# Altium footprint library Connector_PinHeader_2.00mm.PcbLib: 278 footprints (part 2 of 18)
Each footprint in its own frame and in the unit in brackets; x right, y up, seen from the top. Pads: shape width x height; smd on the part's side, far side on the other; paste and mask are expansions set on the pad; w line width, h text height; cw(c..) or ccw(c..) is an arc to the next point about the centre after c.
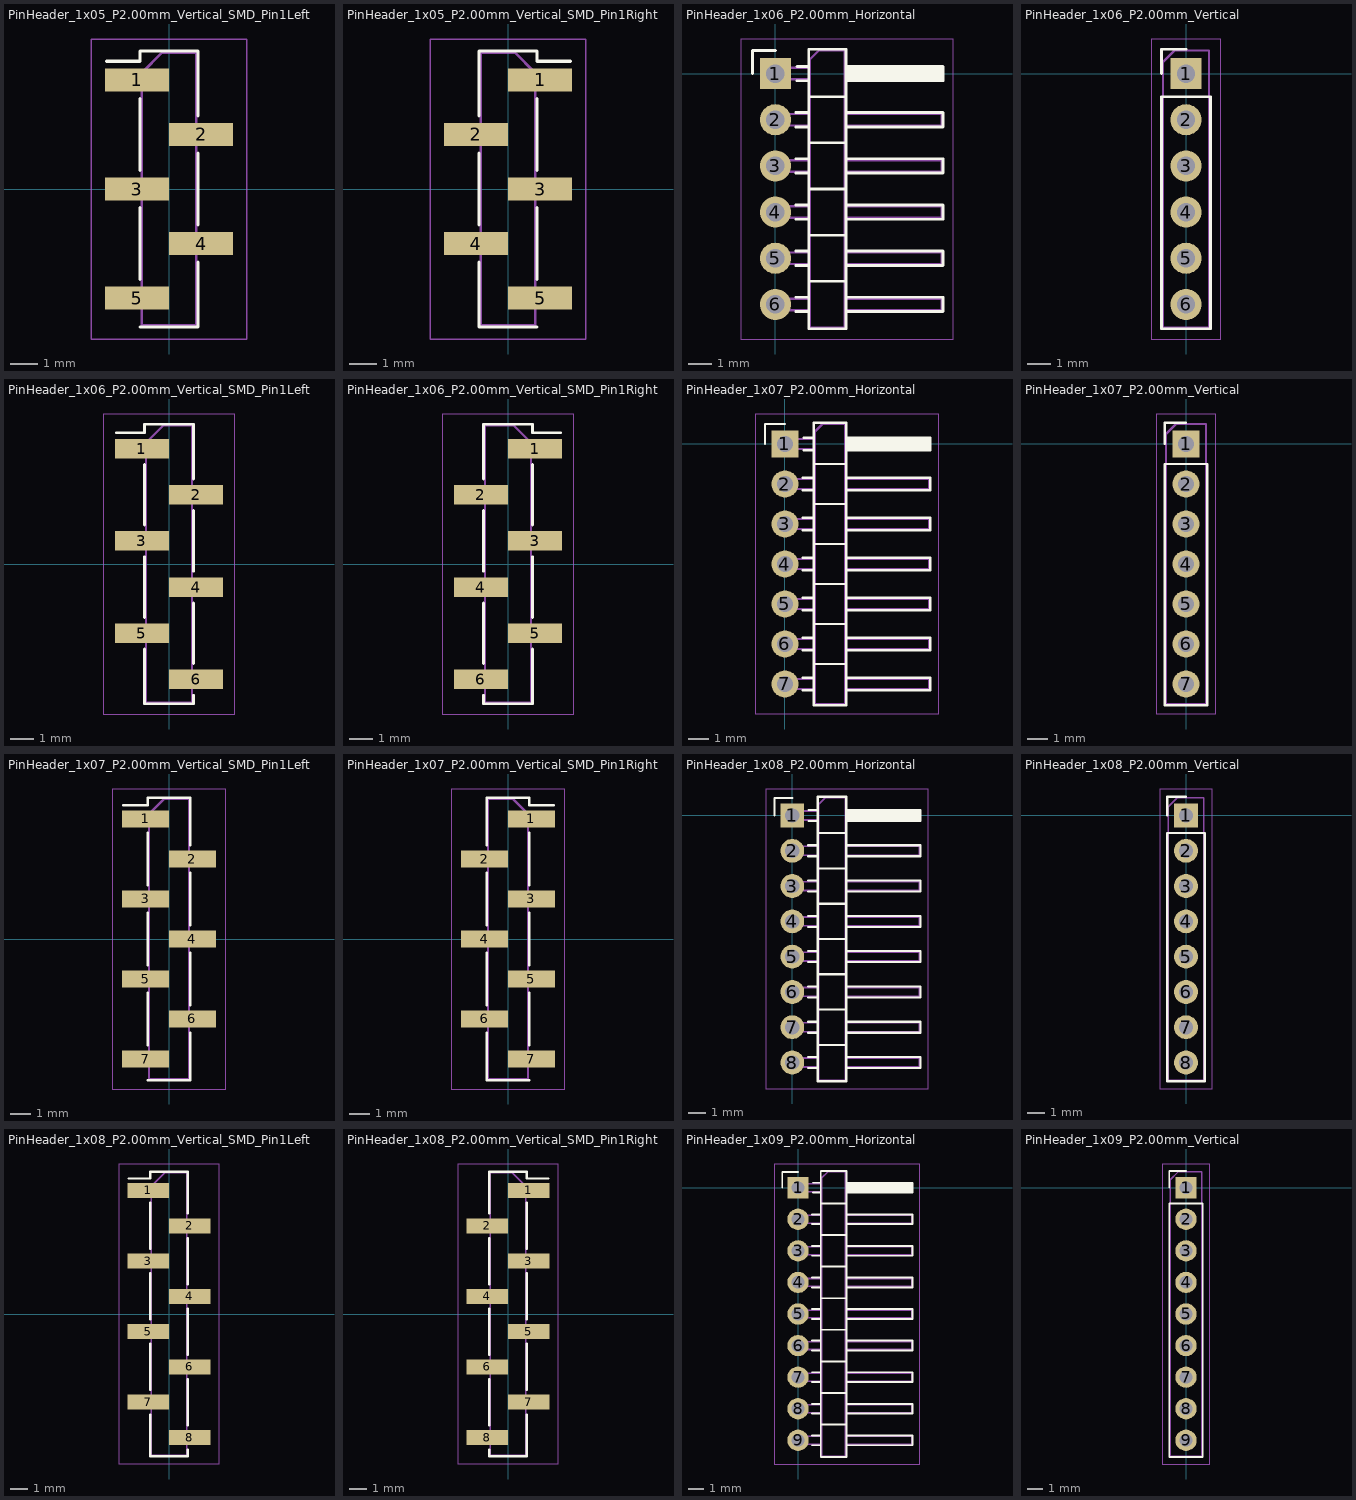
[diagram p1: the footprints below, top view; thin cyan lines are the x and y axes]

## PinHeader_1x05_P2.00mm_Vertical_SMD_Pin1Left [mm]
pads (5):
  rect 2.35x0.85 smd: 1(-1.175,4) 2(1.175,2) 3(-1.175,0) 4(1.175,-2) 5(-1.175,-4)
F.SilkS:
  lines w0.12: -2.29,4.685 -1.06,4.685 -1.06,5.06 1.06,5.06 1.06,2.685 ; -1.06,-5.06 1.06,-5.06 ; -1.06,-3.315 -1.06,-0.685 ; -1.06,0.685 -1.06,3.315 ; 1.06,-4.685 1.06,-5.06 ; 1.06,-2.685 1.06,-5.06 ; 1.06,-1.315 1.06,1.315
F.CrtYd:
  lines w0.05: -2.85,-5.5 2.85,-5.5 2.85,5.5 -2.85,5.5 -2.85,-5.5
F.Fab:
  lines w0.1: -1,-4.25 -2.1,-4.25 -2.1,-3.75 -1,-3.75 ; -1,-0.25 -2.1,-0.25 -2.1,0.25 -1,0.25 ; -1,3.75 -2.1,3.75 -2.1,4.25 -1,4.25 ; 1,-2.25 2.1,-2.25 2.1,-1.75 1,-1.75 ; 1,1.75 2.1,1.75 2.1,2.25 1,2.25 ; -1,4.25 -0.25,5 1,5 1,-5 -1,-5 -1,4.25
  text "'.Designator'" at 0.84,-4.047 h1

## PinHeader_1x05_P2.00mm_Vertical_SMD_Pin1Right [mm]
pads (5):
  rect 2.35x0.85 smd: 1(1.175,4) 2(-1.175,2) 3(1.175,0) 4(-1.175,-2) 5(1.175,-4)
F.SilkS:
  lines w0.12: -1.06,-4.685 -1.06,-5.06 ; -1.06,-2.685 -1.06,-5.06 ; -1.06,-1.315 -1.06,1.315 ; -1.06,2.685 -1.06,5.06 1.06,5.06 1.06,4.685 2.29,4.685 ; 1.06,-5.06 -1.06,-5.06 ; 1.06,-3.315 1.06,-0.685 ; 1.06,0.685 1.06,3.315
F.CrtYd:
  lines w0.05: -2.85,-5.5 -2.85,5.5 2.85,5.5 2.85,-5.5 -2.85,-5.5
F.Fab:
  lines w0.1: -1,-2.25 -2.1,-2.25 -2.1,-1.75 -1,-1.75 ; -1,1.75 -2.1,1.75 -2.1,2.25 -1,2.25 ; 1,-4.25 2.1,-4.25 2.1,-3.75 1,-3.75 ; 1,-0.25 2.1,-0.25 2.1,0.25 1,0.25 ; 1,3.75 2.1,3.75 2.1,4.25 1,4.25 ; 1,4.25 1,-5 -1,-5 -1,5 0.25,5 1,4.25
  text "'.Designator'" at 0.84,-4.047 h1

## PinHeader_1x06_P2.00mm_Horizontal [mm]
pads (6):
  rect 1.35x1.35 hole 0.8: 1(0,0)
  rrect100% 1.35x1.35 hole 0.8: 2(0,-2) 3(0,-4) 4(0,-6) 5(0,-8) 6(0,-10)
F.SilkS:
  lines w0.12: -1,0 -1,1 0,1 ; 0.882,-10.31 1.44,-10.31 ; 0.882,-9.69 1.44,-9.69 ; 0.882,-8.31 1.44,-8.31 ; 0.882,-7.69 1.44,-7.69 ; 0.882,-6.31 1.44,-6.31 ; 0.882,-5.69 1.44,-5.69 ; 0.882,-4.31 1.44,-4.31 ; 0.882,-3.69 1.44,-3.69 ; 0.882,-2.31 1.44,-2.31 ; 0.882,-1.69 1.44,-1.69 ; 0.935,-0.31 1.44,-0.31 ; 0.935,0.31 1.44,0.31 ; 1.44,-9 3.06,-9 ; 1.44,-7 3.06,-7 ; 1.44,-5 3.06,-5 ; 1.44,-3 3.06,-3 ; 1.44,-1 3.06,-1 ; 3.06,-10.31 7.26,-10.31 7.26,-9.69 3.06,-9.69 ; 3.06,-8.31 7.26,-8.31 7.26,-7.69 3.06,-7.69 ; 3.06,-6.31 7.26,-6.31 7.26,-5.69 3.06,-5.69 ; 3.06,-4.31 7.26,-4.31 7.26,-3.69 3.06,-3.69 ; 3.06,-2.31 7.26,-2.31 7.26,-1.69 3.06,-1.69 ; 3.06,-0.31 7.26,-0.31 7.26,0.31 3.06,0.31 ; 3.06,-0.23 7.26,-0.23 ; 3.06,-0.11 7.26,-0.11 ; 3.06,0.01 7.26,0.01 ; 3.06,0.13 7.26,0.13 ; 3.06,0.25 7.26,0.25 ; 1.44,-11.06 1.44,1.06 3.06,1.06 3.06,-11.06 1.44,-11.06
F.CrtYd:
  lines w0.05: -1.5,-11.5 7.7,-11.5 7.7,1.5 -1.5,1.5 -1.5,-11.5
F.Fab:
  lines w0.1: 1.5,-10.25 -0.25,-10.25 -0.25,-9.75 1.5,-9.75 ; 1.5,-8.25 -0.25,-8.25 -0.25,-7.75 1.5,-7.75 ; 1.5,-6.25 -0.25,-6.25 -0.25,-5.75 1.5,-5.75 ; 1.5,-4.25 -0.25,-4.25 -0.25,-3.75 1.5,-3.75 ; 1.5,-2.25 -0.25,-2.25 -0.25,-1.75 1.5,-1.75 ; 1.5,-0.25 -0.25,-0.25 -0.25,0.25 1.5,0.25 ; 3,-10.25 7.2,-10.25 7.2,-9.75 3,-9.75 ; 3,-8.25 7.2,-8.25 7.2,-7.75 3,-7.75 ; 3,-6.25 7.2,-6.25 7.2,-5.75 3,-5.75 ; 3,-4.25 7.2,-4.25 7.2,-3.75 3,-3.75 ; 3,-2.25 7.2,-2.25 7.2,-1.75 3,-1.75 ; 3,-0.25 7.2,-0.25 7.2,0.25 3,0.25 ; 1.5,-11 1.5,0.625 1.875,1 3,1 3,-11 1.5,-11
  text "'.Designator'" at 3.006,-8.642 h0.9

## PinHeader_1x06_P2.00mm_Vertical [mm]
pads (6):
  rect 1.35x1.35 hole 0.8: 1(0,0)
  rrect100% 1.35x1.35 hole 0.8: 2(0,-2) 3(0,-4) 4(0,-6) 5(0,-8) 6(0,-10)
F.SilkS:
  lines w0.12: -1.06,0 -1.06,1.06 0,1.06 ; -1.06,-11.06 1.06,-11.06 1.06,-1 -1.06,-1 -1.06,-11.06
F.CrtYd:
  lines w0.05: -1.5,-11.5 -1.5,1.5 1.5,1.5 1.5,-11.5 -1.5,-11.5
F.Fab:
  lines w0.1: -1,-11 -1,0.5 -0.5,1 1,1 1,-11 -1,-11
  text "'.Designator'" at 0.84,-9.047 h1

## PinHeader_1x06_P2.00mm_Vertical_SMD_Pin1Left [mm]
pads (6):
  rect 2.35x0.85 smd: 1(-1.175,5) 2(1.175,3) 3(-1.175,1) 4(1.175,-1) 5(-1.175,-3) 6(1.175,-5)
F.SilkS:
  lines w0.12: -2.29,5.685 -1.06,5.685 -1.06,6.06 1.06,6.06 1.06,3.685 ; -1.06,-3.685 -1.06,-6.06 1.06,-6.06 1.06,-5.685 ; -1.06,-2.315 -1.06,0.315 ; -1.06,1.685 -1.06,4.315 ; 1.06,-4.315 1.06,-1.685 ; 1.06,-0.315 1.06,2.315
F.CrtYd:
  lines w0.05: -2.85,-6.5 2.85,-6.5 2.85,6.5 -2.85,6.5 -2.85,-6.5
F.Fab:
  lines w0.1: -1,-3.25 -2.1,-3.25 -2.1,-2.75 -1,-2.75 ; -1,0.75 -2.1,0.75 -2.1,1.25 -1,1.25 ; -1,4.75 -2.1,4.75 -2.1,5.25 -1,5.25 ; 1,-5.25 2.1,-5.25 2.1,-4.75 1,-4.75 ; 1,-1.25 2.1,-1.25 2.1,-0.75 1,-0.75 ; 1,2.75 2.1,2.75 2.1,3.25 1,3.25 ; -1,5.25 -0.25,6 1,6 1,-6 -1,-6 -1,5.25
  text "'.Designator'" at 0.84,-4.047 h1

## PinHeader_1x06_P2.00mm_Vertical_SMD_Pin1Right [mm]
pads (6):
  rect 2.35x0.85 smd: 1(1.175,5) 2(-1.175,3) 3(1.175,1) 4(-1.175,-1) 5(1.175,-3) 6(-1.175,-5)
F.SilkS:
  lines w0.12: -1.06,-5.685 -1.06,-6.06 1.06,-6.06 1.06,-3.685 ; -1.06,-4.315 -1.06,-1.685 ; -1.06,-0.315 -1.06,2.315 ; -1.06,3.685 -1.06,6.06 1.06,6.06 1.06,5.685 2.29,5.685 ; 1.06,-2.315 1.06,0.315 ; 1.06,1.685 1.06,4.315
F.CrtYd:
  lines w0.05: -2.85,-6.5 -2.85,6.5 2.85,6.5 2.85,-6.5 -2.85,-6.5
F.Fab:
  lines w0.1: -1,-5.25 -2.1,-5.25 -2.1,-4.75 -1,-4.75 ; -1,-1.25 -2.1,-1.25 -2.1,-0.75 -1,-0.75 ; -1,2.75 -2.1,2.75 -2.1,3.25 -1,3.25 ; 1,-3.25 2.1,-3.25 2.1,-2.75 1,-2.75 ; 1,0.75 2.1,0.75 2.1,1.25 1,1.25 ; 1,4.75 2.1,4.75 2.1,5.25 1,5.25 ; 1,5.25 0.25,6 -1,6 -1,-6 1,-6 1,5.25
  text "'.Designator'" at 0.84,-4.047 h1

## PinHeader_1x07_P2.00mm_Horizontal [mm]
pads (7):
  rect 1.35x1.35 hole 0.8: 1(0,0)
  rrect100% 1.35x1.35 hole 0.8: 2(0,-2) 3(0,-4) 4(0,-6) 5(0,-8) 6(0,-10) 7(0,-12)
F.SilkS:
  lines w0.12: -1,0 -1,1 0,1 ; 0.882,-12.31 1.44,-12.31 ; 0.882,-11.69 1.44,-11.69 ; 0.882,-10.31 1.44,-10.31 ; 0.882,-9.69 1.44,-9.69 ; 0.882,-8.31 1.44,-8.31 ; 0.882,-7.69 1.44,-7.69 ; 0.882,-6.31 1.44,-6.31 ; 0.882,-5.69 1.44,-5.69 ; 0.882,-4.31 1.44,-4.31 ; 0.882,-3.69 1.44,-3.69 ; 0.882,-2.31 1.44,-2.31 ; 0.882,-1.69 1.44,-1.69 ; 0.935,-0.31 1.44,-0.31 ; 0.935,0.31 1.44,0.31 ; 1.44,-11 3.06,-11 ; 1.44,-9 3.06,-9 ; 1.44,-7 3.06,-7 ; 1.44,-5 3.06,-5 ; 1.44,-3 3.06,-3 ; 1.44,-1 3.06,-1 ; 3.06,-12.31 7.26,-12.31 7.26,-11.69 3.06,-11.69 ; 3.06,-10.31 7.26,-10.31 7.26,-9.69 3.06,-9.69 ; 3.06,-8.31 7.26,-8.31 7.26,-7.69 3.06,-7.69 ; 3.06,-6.31 7.26,-6.31 7.26,-5.69 3.06,-5.69 ; 3.06,-4.31 7.26,-4.31 7.26,-3.69 3.06,-3.69 ; 3.06,-2.31 7.26,-2.31 7.26,-1.69 3.06,-1.69 ; 3.06,-0.31 7.26,-0.31 7.26,0.31 3.06,0.31 ; 3.06,-0.23 7.26,-0.23 ; 3.06,-0.11 7.26,-0.11 ; 3.06,0.01 7.26,0.01 ; 3.06,0.13 7.26,0.13 ; 3.06,0.25 7.26,0.25 ; 1.44,-13.06 3.06,-13.06 3.06,1.06 1.44,1.06 1.44,-13.06
F.CrtYd:
  lines w0.05: -1.5,-13.5 -1.5,1.5 7.7,1.5 7.7,-13.5 -1.5,-13.5
F.Fab:
  lines w0.1: 1.5,-12.25 -0.25,-12.25 -0.25,-11.75 1.5,-11.75 ; 1.5,-10.25 -0.25,-10.25 -0.25,-9.75 1.5,-9.75 ; 1.5,-8.25 -0.25,-8.25 -0.25,-7.75 1.5,-7.75 ; 1.5,-6.25 -0.25,-6.25 -0.25,-5.75 1.5,-5.75 ; 1.5,-4.25 -0.25,-4.25 -0.25,-3.75 1.5,-3.75 ; 1.5,-2.25 -0.25,-2.25 -0.25,-1.75 1.5,-1.75 ; 1.5,-0.25 -0.25,-0.25 -0.25,0.25 1.5,0.25 ; 3,-12.25 7.2,-12.25 7.2,-11.75 3,-11.75 ; 3,-10.25 7.2,-10.25 7.2,-9.75 3,-9.75 ; 3,-8.25 7.2,-8.25 7.2,-7.75 3,-7.75 ; 3,-6.25 7.2,-6.25 7.2,-5.75 3,-5.75 ; 3,-4.25 7.2,-4.25 7.2,-3.75 3,-3.75 ; 3,-2.25 7.2,-2.25 7.2,-1.75 3,-1.75 ; 3,-0.25 7.2,-0.25 7.2,0.25 3,0.25 ; 1.5,-13 1.5,0.625 1.875,1 3,1 3,-13 1.5,-13
  text "'.Designator'" at 3.006,-9.642 h0.9

## PinHeader_1x07_P2.00mm_Vertical [mm]
pads (7):
  rect 1.35x1.35 hole 0.8: 1(0,0)
  rrect100% 1.35x1.35 hole 0.8: 2(0,-2) 3(0,-4) 4(0,-6) 5(0,-8) 6(0,-10) 7(0,-12)
F.SilkS:
  lines w0.12: -1.06,0 -1.06,1.06 0,1.06 ; -1.06,-13.06 1.06,-13.06 1.06,-1 -1.06,-1 -1.06,-13.06
F.CrtYd:
  lines w0.05: -1.5,-13.5 1.5,-13.5 1.5,1.5 -1.5,1.5 -1.5,-13.5
F.Fab:
  lines w0.1: -1,-13 -1,0.5 -0.5,1 1,1 1,-13 -1,-13
  text "'.Designator'" at 0.84,-10.047 h1

## PinHeader_1x07_P2.00mm_Vertical_SMD_Pin1Left [mm]
pads (7):
  rect 2.35x0.85 smd: 1(-1.175,6) 2(1.175,4) 3(-1.175,2) 4(1.175,0) 5(-1.175,-2) 6(1.175,-4) 7(-1.175,-6)
F.SilkS:
  lines w0.12: -2.29,6.685 -1.06,6.685 -1.06,7.06 1.06,7.06 1.06,4.685 ; -1.06,-7.06 1.06,-7.06 ; -1.06,-5.315 -1.06,-2.685 ; -1.06,-1.315 -1.06,1.315 ; -1.06,2.685 -1.06,5.315 ; 1.06,-6.685 1.06,-7.06 ; 1.06,-4.685 1.06,-7.06 ; 1.06,-3.315 1.06,-0.685 ; 1.06,0.685 1.06,3.315
F.CrtYd:
  lines w0.05: -2.85,-7.5 -2.85,7.5 2.85,7.5 2.85,-7.5 -2.85,-7.5
F.Fab:
  lines w0.1: -1,-6.25 -2.1,-6.25 -2.1,-5.75 -1,-5.75 ; -1,-2.25 -2.1,-2.25 -2.1,-1.75 -1,-1.75 ; -1,1.75 -2.1,1.75 -2.1,2.25 -1,2.25 ; -1,5.75 -2.1,5.75 -2.1,6.25 -1,6.25 ; 1,-4.25 2.1,-4.25 2.1,-3.75 1,-3.75 ; 1,-0.25 2.1,-0.25 2.1,0.25 1,0.25 ; 1,3.75 2.1,3.75 2.1,4.25 1,4.25 ; -1,6.25 -1,-7 1,-7 1,7 -0.25,7 -1,6.25
  text "'.Designator'" at 0.84,-4.047 h1

## PinHeader_1x07_P2.00mm_Vertical_SMD_Pin1Right [mm]
pads (7):
  rect 2.35x0.85 smd: 1(1.175,6) 2(-1.175,4) 3(1.175,2) 4(-1.175,0) 5(1.175,-2) 6(-1.175,-4) 7(1.175,-6)
F.SilkS:
  lines w0.12: -1.06,-6.685 -1.06,-7.06 ; -1.06,-4.685 -1.06,-7.06 ; -1.06,-3.315 -1.06,-0.685 ; -1.06,0.685 -1.06,3.315 ; -1.06,4.685 -1.06,7.06 1.06,7.06 1.06,6.685 2.29,6.685 ; 1.06,-7.06 -1.06,-7.06 ; 1.06,-5.315 1.06,-2.685 ; 1.06,-1.315 1.06,1.315 ; 1.06,2.685 1.06,5.315
F.CrtYd:
  lines w0.05: -2.85,-7.5 -2.85,7.5 2.85,7.5 2.85,-7.5 -2.85,-7.5
F.Fab:
  lines w0.1: -1,-4.25 -2.1,-4.25 -2.1,-3.75 -1,-3.75 ; -1,-0.25 -2.1,-0.25 -2.1,0.25 -1,0.25 ; -1,3.75 -2.1,3.75 -2.1,4.25 -1,4.25 ; 1,-6.25 2.1,-6.25 2.1,-5.75 1,-5.75 ; 1,-2.25 2.1,-2.25 2.1,-1.75 1,-1.75 ; 1,1.75 2.1,1.75 2.1,2.25 1,2.25 ; 1,5.75 2.1,5.75 2.1,6.25 1,6.25 ; 1,6.25 1,-7 -1,-7 -1,7 0.25,7 1,6.25
  text "'.Designator'" at 0.84,-4.047 h1

## PinHeader_1x08_P2.00mm_Horizontal [mm]
pads (8):
  rect 1.35x1.35 hole 0.8: 1(0,0)
  rrect100% 1.35x1.35 hole 0.8: 2(0,-2) 3(0,-4) 4(0,-6) 5(0,-8) 6(0,-10) 7(0,-12) 8(0,-14)
F.SilkS:
  lines w0.12: -1,0 -1,1 0,1 ; 0.882,-14.31 1.44,-14.31 ; 0.882,-13.69 1.44,-13.69 ; 0.882,-12.31 1.44,-12.31 ; 0.882,-11.69 1.44,-11.69 ; 0.882,-10.31 1.44,-10.31 ; 0.882,-9.69 1.44,-9.69 ; 0.882,-8.31 1.44,-8.31 ; 0.882,-7.69 1.44,-7.69 ; 0.882,-6.31 1.44,-6.31 ; 0.882,-5.69 1.44,-5.69 ; 0.882,-4.31 1.44,-4.31 ; 0.882,-3.69 1.44,-3.69 ; 0.882,-2.31 1.44,-2.31 ; 0.882,-1.69 1.44,-1.69 ; 0.935,-0.31 1.44,-0.31 ; 0.935,0.31 1.44,0.31 ; 1.44,-13 3.06,-13 ; 1.44,-11 3.06,-11 ; 1.44,-9 3.06,-9 ; 1.44,-7 3.06,-7 ; 1.44,-5 3.06,-5 ; 1.44,-3 3.06,-3 ; 1.44,-1 3.06,-1 ; 3.06,-14.31 7.26,-14.31 7.26,-13.69 3.06,-13.69 ; 3.06,-12.31 7.26,-12.31 7.26,-11.69 3.06,-11.69 ; 3.06,-10.31 7.26,-10.31 7.26,-9.69 3.06,-9.69 ; 3.06,-8.31 7.26,-8.31 7.26,-7.69 3.06,-7.69 ; 3.06,-6.31 7.26,-6.31 7.26,-5.69 3.06,-5.69 ; 3.06,-4.31 7.26,-4.31 7.26,-3.69 3.06,-3.69 ; 3.06,-2.31 7.26,-2.31 7.26,-1.69 3.06,-1.69 ; 3.06,-0.31 7.26,-0.31 7.26,0.31 3.06,0.31 ; 3.06,-0.23 7.26,-0.23 ; 3.06,-0.11 7.26,-0.11 ; 3.06,0.01 7.26,0.01 ; 3.06,0.13 7.26,0.13 ; 3.06,0.25 7.26,0.25 ; 1.44,-15.06 1.44,1.06 3.06,1.06 3.06,-15.06 1.44,-15.06
F.CrtYd:
  lines w0.05: -1.5,-15.5 -1.5,1.5 7.7,1.5 7.7,-15.5 -1.5,-15.5
F.Fab:
  lines w0.1: 1.5,-14.25 -0.25,-14.25 -0.25,-13.75 1.5,-13.75 ; 1.5,-12.25 -0.25,-12.25 -0.25,-11.75 1.5,-11.75 ; 1.5,-10.25 -0.25,-10.25 -0.25,-9.75 1.5,-9.75 ; 1.5,-8.25 -0.25,-8.25 -0.25,-7.75 1.5,-7.75 ; 1.5,-6.25 -0.25,-6.25 -0.25,-5.75 1.5,-5.75 ; 1.5,-4.25 -0.25,-4.25 -0.25,-3.75 1.5,-3.75 ; 1.5,-2.25 -0.25,-2.25 -0.25,-1.75 1.5,-1.75 ; 1.5,-0.25 -0.25,-0.25 -0.25,0.25 1.5,0.25 ; 3,-14.25 7.2,-14.25 7.2,-13.75 3,-13.75 ; 3,-12.25 7.2,-12.25 7.2,-11.75 3,-11.75 ; 3,-10.25 7.2,-10.25 7.2,-9.75 3,-9.75 ; 3,-8.25 7.2,-8.25 7.2,-7.75 3,-7.75 ; 3,-6.25 7.2,-6.25 7.2,-5.75 3,-5.75 ; 3,-4.25 7.2,-4.25 7.2,-3.75 3,-3.75 ; 3,-2.25 7.2,-2.25 7.2,-1.75 3,-1.75 ; 3,-0.25 7.2,-0.25 7.2,0.25 3,0.25 ; 1.5,-15 3,-15 3,1 1.875,1 1.5,0.625 1.5,-15
  text "'.Designator'" at 3.006,-10.642 h0.9

## PinHeader_1x08_P2.00mm_Vertical [mm]
pads (8):
  rect 1.35x1.35 hole 0.8: 1(0,0)
  rrect100% 1.35x1.35 hole 0.8: 2(0,-2) 3(0,-4) 4(0,-6) 5(0,-8) 6(0,-10) 7(0,-12) 8(0,-14)
F.SilkS:
  lines w0.12: -1.06,0 -1.06,1.06 0,1.06 ; -1.06,-15.06 1.06,-15.06 1.06,-1 -1.06,-1 -1.06,-15.06
F.CrtYd:
  lines w0.05: -1.5,-15.5 -1.5,1.5 1.5,1.5 1.5,-15.5 -1.5,-15.5
F.Fab:
  lines w0.1: -1,-15 1,-15 1,1 -0.5,1 -1,0.5 -1,-15
  text "'.Designator'" at 0.84,-11.047 h1

## PinHeader_1x08_P2.00mm_Vertical_SMD_Pin1Left [mm]
pads (8):
  rect 2.35x0.85 smd: 1(-1.175,7) 2(1.175,5) 3(-1.175,3) 4(1.175,1) 5(-1.175,-1) 6(1.175,-3) 7(-1.175,-5) 8(1.175,-7)
F.SilkS:
  lines w0.12: -2.29,7.685 -1.06,7.685 -1.06,8.06 1.06,8.06 1.06,5.685 ; -1.06,-5.685 -1.06,-8.06 1.06,-8.06 1.06,-7.685 ; -1.06,-4.315 -1.06,-1.685 ; -1.06,-0.315 -1.06,2.315 ; -1.06,3.685 -1.06,6.315 ; 1.06,-6.315 1.06,-3.685 ; 1.06,-2.315 1.06,0.315 ; 1.06,1.685 1.06,4.315
F.CrtYd:
  lines w0.05: -2.85,-8.5 2.85,-8.5 2.85,8.5 -2.85,8.5 -2.85,-8.5
F.Fab:
  lines w0.1: -1,-5.25 -2.1,-5.25 -2.1,-4.75 -1,-4.75 ; -1,-1.25 -2.1,-1.25 -2.1,-0.75 -1,-0.75 ; -1,2.75 -2.1,2.75 -2.1,3.25 -1,3.25 ; -1,6.75 -2.1,6.75 -2.1,7.25 -1,7.25 ; 1,-7.25 2.1,-7.25 2.1,-6.75 1,-6.75 ; 1,-3.25 2.1,-3.25 2.1,-2.75 1,-2.75 ; 1,0.75 2.1,0.75 2.1,1.25 1,1.25 ; 1,4.75 2.1,4.75 2.1,5.25 1,5.25 ; -1,7.25 -0.25,8 1,8 1,-8 -1,-8 -1,7.25
  text "'.Designator'" at 0.84,-4.047 h1

## PinHeader_1x08_P2.00mm_Vertical_SMD_Pin1Right [mm]
pads (8):
  rect 2.35x0.85 smd: 1(1.175,7) 2(-1.175,5) 3(1.175,3) 4(-1.175,1) 5(1.175,-1) 6(-1.175,-3) 7(1.175,-5) 8(-1.175,-7)
F.SilkS:
  lines w0.12: -1.06,-7.685 -1.06,-8.06 1.06,-8.06 1.06,-5.685 ; -1.06,-6.315 -1.06,-3.685 ; -1.06,-2.315 -1.06,0.315 ; -1.06,1.685 -1.06,4.315 ; -1.06,5.685 -1.06,8.06 1.06,8.06 1.06,7.685 2.29,7.685 ; 1.06,-4.315 1.06,-1.685 ; 1.06,-0.315 1.06,2.315 ; 1.06,3.685 1.06,6.315
F.CrtYd:
  lines w0.05: -2.85,-8.5 -2.85,8.5 2.85,8.5 2.85,-8.5 -2.85,-8.5
F.Fab:
  lines w0.1: -1,-7.25 -2.1,-7.25 -2.1,-6.75 -1,-6.75 ; -1,-3.25 -2.1,-3.25 -2.1,-2.75 -1,-2.75 ; -1,0.75 -2.1,0.75 -2.1,1.25 -1,1.25 ; -1,4.75 -2.1,4.75 -2.1,5.25 -1,5.25 ; 1,-5.25 2.1,-5.25 2.1,-4.75 1,-4.75 ; 1,-1.25 2.1,-1.25 2.1,-0.75 1,-0.75 ; 1,2.75 2.1,2.75 2.1,3.25 1,3.25 ; 1,6.75 2.1,6.75 2.1,7.25 1,7.25 ; 1,7.25 0.25,8 -1,8 -1,-8 1,-8 1,7.25
  text "'.Designator'" at 0.84,-4.047 h1

## PinHeader_1x09_P2.00mm_Horizontal [mm]
pads (9):
  rect 1.35x1.35 hole 0.8: 1(0,0)
  rrect100% 1.35x1.35 hole 0.8: 2(0,-2) 3(0,-4) 4(0,-6) 5(0,-8) 6(0,-10) 7(0,-12) 8(0,-14) 9(0,-16)
F.SilkS:
  lines w0.12: -1,0 -1,1 0,1 ; 0.882,-16.31 1.44,-16.31 ; 0.882,-15.69 1.44,-15.69 ; 0.882,-14.31 1.44,-14.31 ; 0.882,-13.69 1.44,-13.69 ; 0.882,-12.31 1.44,-12.31 ; 0.882,-11.69 1.44,-11.69 ; 0.882,-10.31 1.44,-10.31 ; 0.882,-9.69 1.44,-9.69 ; 0.882,-8.31 1.44,-8.31 ; 0.882,-7.69 1.44,-7.69 ; 0.882,-6.31 1.44,-6.31 ; 0.882,-5.69 1.44,-5.69 ; 0.882,-4.31 1.44,-4.31 ; 0.882,-3.69 1.44,-3.69 ; 0.882,-2.31 1.44,-2.31 ; 0.882,-1.69 1.44,-1.69 ; 0.935,-0.31 1.44,-0.31 ; 0.935,0.31 1.44,0.31 ; 1.44,-15 3.06,-15 ; 1.44,-13 3.06,-13 ; 1.44,-11 3.06,-11 ; 1.44,-9 3.06,-9 ; 1.44,-7 3.06,-7 ; 1.44,-5 3.06,-5 ; 1.44,-3 3.06,-3 ; 1.44,-1 3.06,-1 ; 3.06,-16.31 7.26,-16.31 7.26,-15.69 3.06,-15.69 ; 3.06,-14.31 7.26,-14.31 7.26,-13.69 3.06,-13.69 ; 3.06,-12.31 7.26,-12.31 7.26,-11.69 3.06,-11.69 ; 3.06,-10.31 7.26,-10.31 7.26,-9.69 3.06,-9.69 ; 3.06,-8.31 7.26,-8.31 7.26,-7.69 3.06,-7.69 ; 3.06,-6.31 7.26,-6.31 7.26,-5.69 3.06,-5.69 ; 3.06,-4.31 7.26,-4.31 7.26,-3.69 3.06,-3.69 ; 3.06,-2.31 7.26,-2.31 7.26,-1.69 3.06,-1.69 ; 3.06,-0.31 7.26,-0.31 7.26,0.31 3.06,0.31 ; 3.06,-0.23 7.26,-0.23 ; 3.06,-0.11 7.26,-0.11 ; 3.06,0.01 7.26,0.01 ; 3.06,0.13 7.26,0.13 ; 3.06,0.25 7.26,0.25 ; 1.44,-17.06 3.06,-17.06 3.06,1.06 1.44,1.06 1.44,-17.06
F.CrtYd:
  lines w0.05: -1.5,-17.5 7.7,-17.5 7.7,1.5 -1.5,1.5 -1.5,-17.5
F.Fab:
  lines w0.1: 1.5,-16.25 -0.25,-16.25 -0.25,-15.75 1.5,-15.75 ; 1.5,-14.25 -0.25,-14.25 -0.25,-13.75 1.5,-13.75 ; 1.5,-12.25 -0.25,-12.25 -0.25,-11.75 1.5,-11.75 ; 1.5,-10.25 -0.25,-10.25 -0.25,-9.75 1.5,-9.75 ; 1.5,-8.25 -0.25,-8.25 -0.25,-7.75 1.5,-7.75 ; 1.5,-6.25 -0.25,-6.25 -0.25,-5.75 1.5,-5.75 ; 1.5,-4.25 -0.25,-4.25 -0.25,-3.75 1.5,-3.75 ; 1.5,-2.25 -0.25,-2.25 -0.25,-1.75 1.5,-1.75 ; 1.5,-0.25 -0.25,-0.25 -0.25,0.25 1.5,0.25 ; 3,-16.25 7.2,-16.25 7.2,-15.75 3,-15.75 ; 3,-14.25 7.2,-14.25 7.2,-13.75 3,-13.75 ; 3,-12.25 7.2,-12.25 7.2,-11.75 3,-11.75 ; 3,-10.25 7.2,-10.25 7.2,-9.75 3,-9.75 ; 3,-8.25 7.2,-8.25 7.2,-7.75 3,-7.75 ; 3,-6.25 7.2,-6.25 7.2,-5.75 3,-5.75 ; 3,-4.25 7.2,-4.25 7.2,-3.75 3,-3.75 ; 3,-2.25 7.2,-2.25 7.2,-1.75 3,-1.75 ; 3,-0.25 7.2,-0.25 7.2,0.25 3,0.25 ; 1.5,-17 1.5,0.625 1.875,1 3,1 3,-17 1.5,-17
  text "'.Designator'" at 3.006,-11.642 h0.9

## PinHeader_1x09_P2.00mm_Vertical [mm]
pads (9):
  rect 1.35x1.35 hole 0.8: 1(0,0)
  rrect100% 1.35x1.35 hole 0.8: 2(0,-2) 3(0,-4) 4(0,-6) 5(0,-8) 6(0,-10) 7(0,-12) 8(0,-14) 9(0,-16)
F.SilkS:
  lines w0.12: -1.06,0 -1.06,1.06 0,1.06 ; -1.06,-17.06 1.06,-17.06 1.06,-1 -1.06,-1 -1.06,-17.06
F.CrtYd:
  lines w0.05: -1.5,-17.5 1.5,-17.5 1.5,1.5 -1.5,1.5 -1.5,-17.5
F.Fab:
  lines w0.1: -1,-17 -1,0.5 -0.5,1 1,1 1,-17 -1,-17
  text "'.Designator'" at 0.84,-12.047 h1